# Altium footprint library CDPcomponents.PcbLib: 40 footprints (part 2 of 3)
Each footprint in its own frame and in the unit in brackets; x right, y up, seen from the top. Pads: shape width x height; smd on the part's side, far side on the other; paste and mask are expansions set on the pad; w line width, h text height; cw(c..) or ccw(c..) is an arc to the next point about the centre after c.
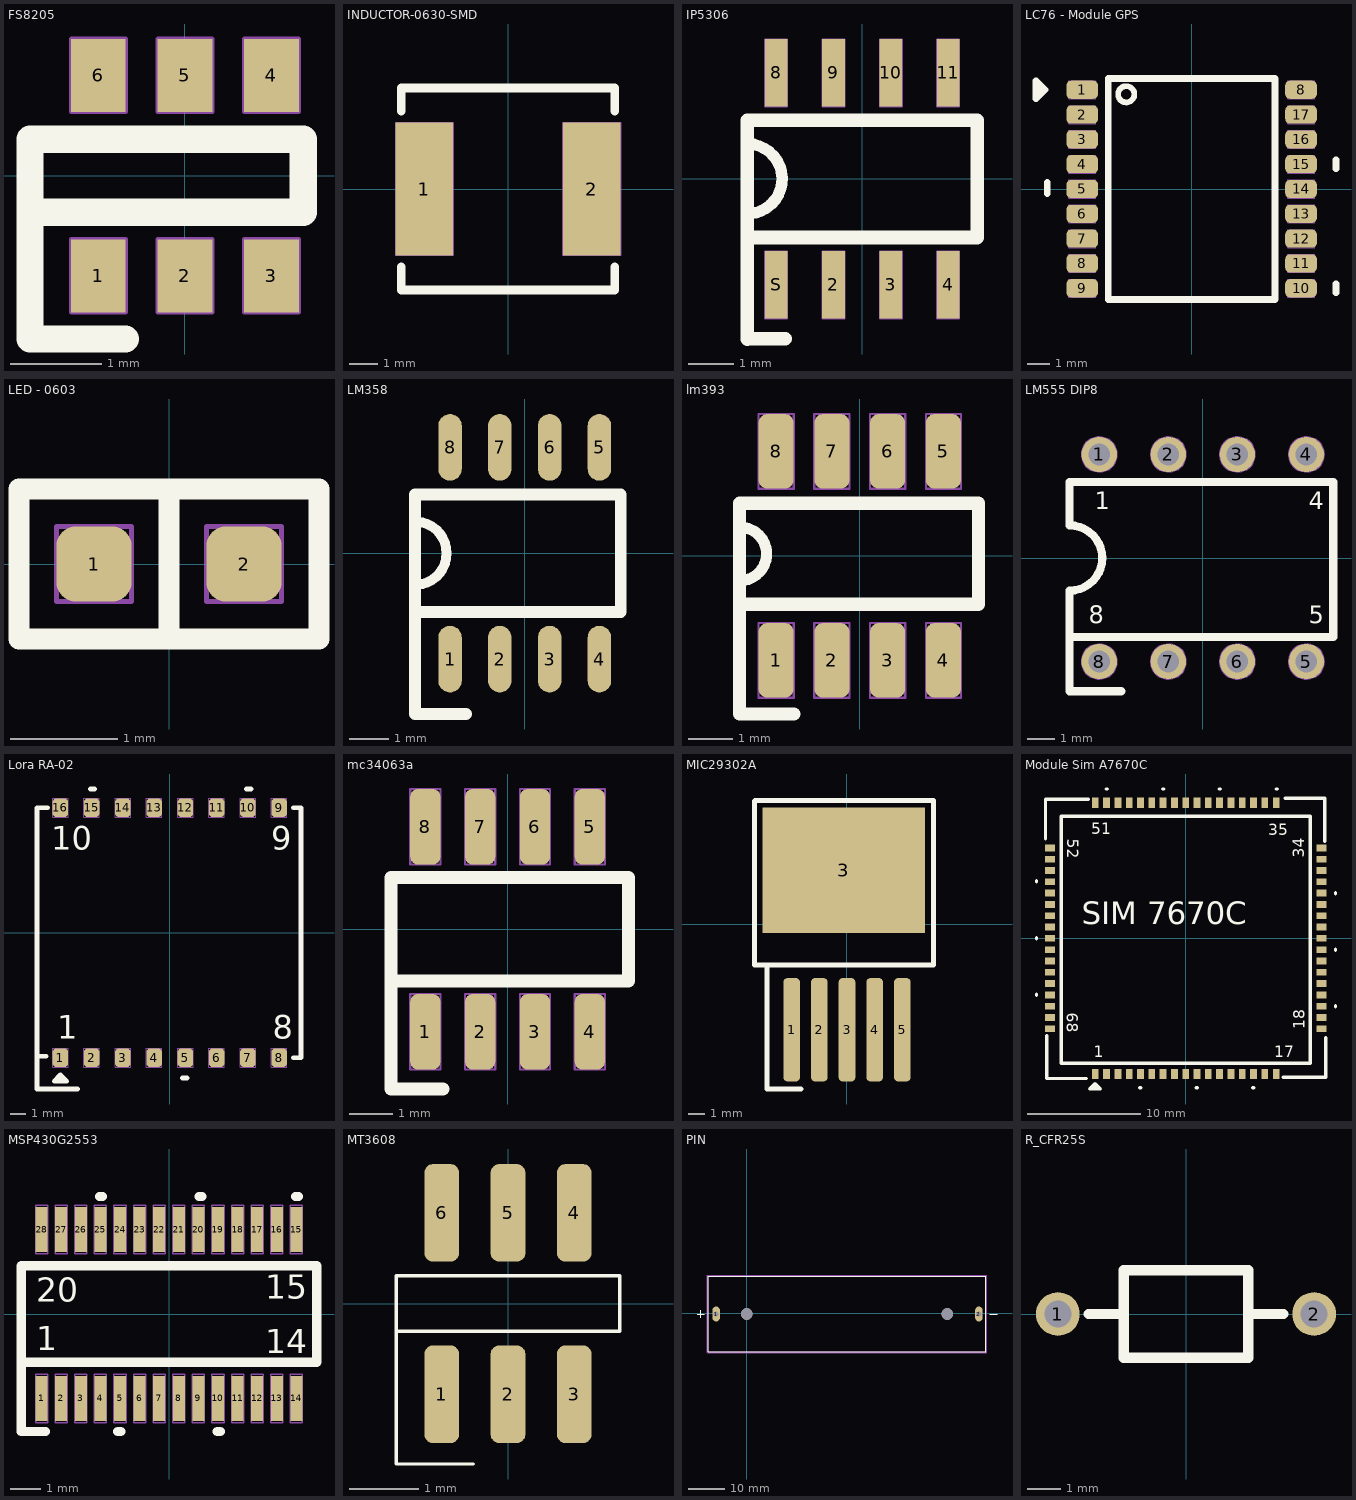
[diagram p1: the footprints below, top view; thin cyan lines are the x and y axes]

## FS8205 [mm]
pads (6):
  rect 0.6x0.8 smd: 1(-0.95,-1.1) 2(0,-1.1) 3(0.95,-1.1) 4(0.95,1.1) 5(0,1.1) 6(-0.95,1.1)
Top Overlay:
  lines w0.3: -1.6,-0.4 1.3,-0.4 1.3,0.4 -1.7,0.4 -1.7,-1.793 -0.652,-1.793
Mechanical 1:
  lines w0.05: -1.25,-1.5 -1.25,-0.7 -0.65,-0.7 -0.65,-1.5 -1.25,-1.5 ; -1.25,0.7 -0.65,0.7 -0.65,1.5 -1.25,1.5 -1.25,0.7 ; -0.3,-1.5 -0.3,-0.7 0.3,-0.7 0.3,-1.5 -0.3,-1.5 ; -0.3,0.7 0.3,0.7 0.3,1.5 -0.3,1.5 -0.3,0.7 ; 0.65,-1.5 0.65,-0.7 1.25,-0.7 1.25,-1.5 0.65,-1.5 ; 0.65,0.7 1.25,0.7 1.25,1.5 0.65,1.5 0.65,0.7
3D body "FS8205.stp": height 1.43, standoff -0.02, extent -1.45,-1.4 1.45,1.4

## INDUCTOR-0630-SMD [mm]
pads (2):
  rect 2x4.6 smd: 1(-2.9,0) 2(2.9,0)
Top Overlay:
  lines w0.3: -3.7,-2.7 -3.7,-3.5 3.7,-3.5 3.7,-2.7 ; -3.7,2.7 -3.7,3.5 3.7,3.5 3.7,2.7
Mechanical 1:
  lines w0.05: -3.9,-2.3 -3.9,2.3 -1.9,2.3 -1.9,-2.3 -3.9,-2.3 ; 1.9,-2.3 3.9,-2.3 3.9,2.3 1.9,2.3 1.9,-2.3
3D body "User Library-FXL0630 v3.STEP": height 2.8, standoff 0, extent -3.5,-3.3 3.5,3.3

## IP5306 [mm]
pads (8):
  rect 0.5x1.5 smd: 2(-0.635,-2.35) 3(0.635,-2.35) 4(1.905,-2.35) 8(-1.905,2.35) 9(-0.635,2.35) 10(0.635,2.35) 11(1.905,2.35) S(-1.905,-2.35)
Top Overlay:
  lines w0.254: -2.495,-0.774 ccw(c-2.55,0) -2.407,0.763
  lines w0.3: -1.7,-3.549 -2.549,-3.549 -2.55,-3.55 -2.55,-1.3 ; -2.55,-1.3 2.55,-1.3 2.55,1.3 -2.55,1.3 -2.55,-1.3
Mechanical 1:
  lines w0.03: -2.155,-3.1 -2.155,-1.6 -1.655,-1.6 -1.655,-3.1 -2.155,-3.1 ; -2.155,1.6 -1.655,1.6 -1.655,3.1 -2.155,3.1 -2.155,1.6 ; -0.885,-3.1 -0.885,-1.6 -0.385,-1.6 -0.385,-3.1 -0.885,-3.1 ; -0.885,1.6 -0.385,1.6 -0.385,3.1 -0.885,3.1 -0.885,1.6 ; 0.385,-3.1 0.385,-1.6 0.885,-1.6 0.885,-3.1 0.385,-3.1 ; 0.385,1.6 0.885,1.6 0.885,3.1 0.385,3.1 0.385,1.6 ; 1.655,-3.1 1.655,-1.6 2.155,-1.6 2.155,-3.1 1.655,-3.1 ; 1.655,1.6 2.155,1.6 2.155,3.1 1.655,3.1 1.655,1.6
3D body "IP5306_4.35V.stp": height 1.65, standoff 0, extent -2.45,-3 2.45,3

## LC76 - Module GPS [mm] "LC760Z00AAMD"
height 30
pads (18):
  rrect50% 1.4x0.8 smd: 1(-4.85,4.4) 2(-4.85,3.3) 3(-4.85,2.2) 4(-4.85,1.1) 5(-4.85,0) 6(-4.85,-1.1) 7(-4.85,-2.2) 8(-4.85,-3.3) 8(4.85,4.4) 9(-4.85,-4.4) 10(4.85,-4.4) 11(4.85,-3.3) 12(4.85,-2.2) 13(4.85,-1.1) 14(4.85,0) 15(4.85,1.1) 16(4.85,2.2) 17(4.85,3.3)
Top Overlay:
  circle w0.254: c-2.9,4.2 r0.361
  lines w0.3: -6.9,4.4 -6.7,4.4 ; -6.4,-0.2 -6.4,0.3 ; 6.4,-4.6 6.4,-4.2 ; 6.4,0.9 6.4,1.3 ; -6.9,4.8 -6.9,4 -6.5,4.4 -6.9,4.8 ; -6.9,4.8 -6.9,4.8 ; -3.7,-4.9 3.7,-4.9 3.7,4.9 0.15,4.9 -3.7,4.9 -3.7,-4.9
Mechanical 1:
  lines w0.05: -5.45,-4.8 -5.45,-4 -4.25,-4 -4.25,-4.8 -5.45,-4.8 ; -5.45,-3.7 -5.45,-2.9 -4.25,-2.9 -4.25,-3.7 -5.45,-3.7 ; -5.45,-2.6 -5.45,-1.8 -4.25,-1.8 -4.25,-2.6 -5.45,-2.6 ; -5.45,-1.5 -5.45,-0.7 -4.25,-0.7 -4.25,-1.5 -5.45,-1.5 ; -5.45,-0.4 -5.45,0.4 -4.25,0.4 -4.25,-0.4 -5.45,-0.4 ; -5.45,0.7 -5.45,1.5 -4.25,1.5 -4.25,0.7 -5.45,0.7 ; -5.45,1.8 -5.45,2.6 -4.25,2.6 -4.25,1.8 -5.45,1.8 ; -5.45,2.9 -5.45,3.7 -4.25,3.7 -4.25,2.9 -5.45,2.9 ; -5.45,4 -4.25,4 -4.25,4.8 -5.45,4.8 -5.45,4 ; 4.25,-4.8 5.45,-4.8 5.45,-4 4.25,-4 4.25,-4.8 ; 4.25,-3.7 4.25,-2.9 5.45,-2.9 5.45,-3.7 4.25,-3.7 ; 4.25,-2.6 4.25,-1.8 5.45,-1.8 5.45,-2.6 4.25,-2.6 ; 4.25,-1.5 4.25,-0.7 5.45,-0.7 5.45,-1.5 4.25,-1.5 ; 4.25,-0.4 4.25,0.4 5.45,0.4 5.45,-0.4 4.25,-0.4 ; 4.25,0.7 4.25,1.5 5.45,1.5 5.45,0.7 4.25,0.7 ; 4.25,1.8 4.25,2.6 5.45,2.6 5.45,1.8 4.25,1.8 ; 4.25,2.9 4.25,3.7 5.45,3.7 5.45,2.9 4.25,2.9 ; 4.25,4 4.25,4.8 5.45,4.8 5.45,4 4.25,4
3D body "Quectel L76-L.stp": height 2.51, standoff -0.01, extent -4.65,-5.05 5.05,5.05

## LED - 0603 [mm]
pads (2):
  rrect50% 0.7x0.7 smd: 1(-0.7,0) 2(0.7,0)
Top Overlay:
  lines w0.2: 0,-0.7 0,0.7 ; -1.4,-0.7 1.4,-0.7 1.4,0.7 0.2,0.7 -1.4,0.7 -1.4,-0.7
Mechanical 1:
  lines w0.05: -1.05,-0.35 -0.7,-0.35 -0.35,-0.35 -0.35,0.35 -1.05,0.35 -1.05,-0.35 ; 0.35,-0.35 0.35,0.35 0.7,0.35 1.05,0.35 1.05,-0.35 0.35,-0.35
3D body "LED0603_Orange.step": height 0.9, standoff 0, extent -0.85,-0.45 0.85,0.45

## LM358 [mm]
pads (8):
  oval 0.6x1.7 smd: 1(-1.905,-2.7) 2(-0.635,-2.7) 3(0.635,-2.7) 4(1.905,-2.7) 5(1.905,2.7) 6(0.635,2.7) 7(-0.635,2.7) 8(-1.905,2.7)
Top Overlay:
  lines w0.254: -2.75,-0.806 ccw(c-2.8,0) -2.75,0.806
  lines w0.3: -1.5,-4.1 -2.8,-4.1 -2.8,-1.5 ; -2.8,-1.5 -2.8,1.5 2.45,1.5 2.45,-1.5 -2.8,-1.5
3D body "LM358D.stp": height 1.63, standoff 0, extent -2.451,-3.011 2.451,3.011

## lm393 [mm]
pads (8):
  rrect50% 0.8x1.7 smd: 1(-1.905,-2.38) 2(-0.635,-2.38) 3(0.635,-2.38) 4(1.905,-2.38) 5(1.905,2.38) 6(0.635,2.38) 7(-0.635,2.38) 8(-1.905,2.38)
Top Overlay:
  lines w0.254: -2.728,-0.564 ccw(c-2.728,0.044) -2.728,0.653
  lines w0.3: -2.731,-1.1 2.7,-1.1 2.7,1.2 -2.731,1.2 -2.739,1.192 -2.739,-3.6 -1.5,-3.6
Mechanical 1:
  lines w0.05: -2.105,-1.53 -1.505,-1.53 -1.505,-3.23 -2.305,-3.23 -2.305,-1.53 -1.905,-1.53 ; -1.905,1.53 -1.505,1.53 -1.505,3.23 -2.305,3.23 -2.305,1.53 -1.705,1.53 ; -0.835,-1.53 -0.235,-1.53 -0.235,-3.23 -1.035,-3.23 -1.035,-1.53 -0.635,-1.53 ; -0.635,1.53 -0.235,1.53 -0.235,3.23 -1.035,3.23 -1.035,1.53 -0.435,1.53 ; 0.435,-1.53 1.035,-1.53 1.035,-3.23 0.235,-3.23 0.235,-1.53 0.635,-1.53 ; 0.635,1.53 1.035,1.53 1.035,3.23 0.235,3.23 0.235,1.53 0.835,1.53 ; 1.705,-1.53 2.305,-1.53 2.305,-3.23 1.505,-3.23 1.505,-1.53 1.905,-1.53 ; 1.905,1.53 2.305,1.53 2.305,3.23 1.505,3.23 1.505,1.53 2.105,1.53
3D body "LM393D.stp": height 1.63, standoff 0, extent -2.451,-3.011 2.451,3.011

## LM555 DIP8 [mm] "LM555 DIP8"
height 4.2
pads (8):
  round 1.3 hole 0.8 mask+0.1: 1(-3.81,3.81) 2(-1.27,3.81) 3(1.27,3.81) 4(3.81,3.81) 5(3.81,-3.81) 6(1.27,-3.81) 7(-1.27,-3.81) 8(-3.81,-3.81)
Top Overlay:
  lines w0.3: -3,-4.9 -4.9,-4.9 -4.9,-2.9 ; -4.9,-2.9 4.8,-2.9 4.8,2.8 -4.8,2.8 -4.9,2.8 -4.9,1.2 cw(c-4.9,0) -4.9,-1.2 -4.9,-2.9
  text "1" at -3.983,1.8 h0.65
  text "4" at 3.9,1.8 h0.65
  text "8" at -4.2,-2.4 h0.65
  text "5" at 3.9,-2.4 h0.65
Mechanical 1:
  circle w0.05: c-3.81,3.81 r0.65
  circle w0.05: c-1.27,3.81 r0.65
  circle w0.05: c1.27,3.81 r0.65
  circle w0.05: c3.81,3.81 r0.65
  circle w0.05: c-3.81,-3.81 r0.65
  circle w0.05: c-1.27,-3.81 r0.65
  circle w0.05: c1.27,-3.81 r0.65
  circle w0.05: c3.81,-3.81 r0.65
  lines w0.05: -4.9,-3 4.9,-3 4.9,2.9 -4.9,2.9 -4.9,1.237 cw(c-4.9,0) -4.9,-1.237 -4.9,-3
3D body "LM555CN.stp": height 5.21, standoff -2.37, extent -4.735,-4.202 4.536,4.002

## Lora RA-02 [mm] "Lora RA-02"
height 12
pads (16):
  rrect50% 1x1.2 smd: 1(-7,-8) 2(-5,-8) 3(-3,-8) 4(-1,-8) 5(1,-8) 6(3,-8) 7(5,-8) 8(7,-8) 9(7,8) 10(5,8) 11(3,8) 12(1,8) 13(-1,8) 14(-3,8) 15(-5,8) 16(-7,8)
Top Overlay:
  lines w0.3: -7.9,-7.9 -8.5,-7.9 ; -7.8,8 -8.5,8 -8.5,-7.9 ; -6.9,-9.3 -6.9,-9.2 ; -5.9,-10 -8.5,-10 -8.5,-7.9 ; -5.1,9.2 -4.8,9.2 ; 0.8,-9.3 1.1,-9.3 ; 4.9,9.2 5.2,9.2 ; 7.9,-8 8.4,-8 8.4,8 7.9,8 ; -7.4,-9.5 -7,-9.1 -6.6,-9.5 -7.4,-9.5
  text "10" at -7.6,5.3 h1.5
  text "9" at 6.5,5.3 h1.5
  text "8" at 6.6,-6.8 h1.5
  text "1" at -7.2,-6.8 h1.5
Mechanical 1:
  lines w0.05: -7.5,-8.6 -7.5,-7.4 ; -7.5,-8.6 -6.5,-8.6 ; -7.5,-8.6 -6.5,-8.6 ; -7.5,-8.6 -7.5,-7.4 ; -7.5,-7.4 -6.5,-7.4 ; -7.5,-7.4 -6.5,-7.4 ; -6.5,-8.6 -6.5,-7.4 ; -6.5,-8.6 -6.5,-7.4 ; 6.5,7.4 7.5,7.4 ; 6.5,7.4 6.5,8.6 ; 6.5,7.4 6.5,8.6 ; 6.5,7.4 7.5,7.4 ; 6.5,8.6 7.5,8.6 ; 6.5,8.6 7.5,8.6 ; 7.5,7.4 7.5,8.6 ; 7.5,7.4 7.5,8.6 ; -7.5,7.4 -7.5,8.6 -6.5,8.6 -6.5,7.4 -7.5,7.4 ; -5.5,-8.6 -5.5,-7.4 -4.5,-7.4 -4.5,-8.6 -5.5,-8.6 ; -5.5,7.4 -5.5,8.6 -4.5,8.6 -4.5,7.4 -5.5,7.4 ; -3.5,-8.6 -3.5,-7.4 -2.5,-7.4 -2.5,-8.6 -3.5,-8.6 ; -3.5,7.4 -3.5,8.6 -2.5,8.6 -2.5,7.4 -3.5,7.4 ; -1.5,-8.6 -1.5,-7.4 -0.5,-7.4 -0.5,-8.6 -1.5,-8.6 ; -1.5,7.4 -1.5,8.6 -0.5,8.6 -0.5,7.4 -1.5,7.4 ; 0.5,-8.6 0.5,-7.4 1.5,-7.4 1.5,-8.6 0.5,-8.6 ; 0.5,7.4 0.5,8.6 1.5,8.6 1.5,7.4 0.5,7.4 ; 2.5,-8.6 2.5,-7.4 3.5,-7.4 3.5,-8.6 2.5,-8.6 ; 2.5,7.4 2.5,8.6 3.5,8.6 3.5,7.4 2.5,7.4 ; 4.5,-8.6 4.5,-7.4 5.5,-7.4 5.5,-8.6 4.5,-8.6 ; 4.5,7.4 4.5,8.6 5.5,8.6 5.5,7.4 4.5,7.4 ; 6.5,-8.6 6.5,-7.4 7.5,-7.4 7.5,-8.6 6.5,-8.6
3D body "User Library-RA-02-2.STEP": height 3.2, standoff 0, extent -8.5,-8 8.5,8

## mc34063a [mm]
pads (8):
  rrect50% 0.7x1.75 smd: 1(-1.905,-2.375) 2(-0.635,-2.375) 3(0.635,-2.375) 4(1.905,-2.375) 5(1.905,2.375) 6(0.635,2.375) 7(-0.635,2.375) 8(-1.905,2.375)
Top Overlay:
  lines w0.3: -1.5,-3.7 -2.7,-3.7 -2.7,-1.2 ; -2.7,-1.2 -2.7,1.2 2.8,1.2 2.8,-1.2 -2.7,-1.2
Mechanical 1:
  lines w0.05: -2.255,-3.25 -1.555,-3.25 -1.555,-1.5 -2.255,-1.5 -2.255,-3.25 ; -2.255,1.5 -2.255,3.25 -1.555,3.25 -1.555,1.5 -2.255,1.5 ; -0.985,-3.25 -0.285,-3.25 -0.285,-1.5 -0.985,-1.5 -0.985,-3.25 ; -0.985,1.5 -0.985,3.25 -0.285,3.25 -0.285,1.5 -0.985,1.5 ; 0.285,-3.25 0.985,-3.25 0.985,-1.5 0.285,-1.5 0.285,-3.25 ; 0.285,1.5 0.285,3.25 0.985,3.25 0.985,1.5 0.285,1.5 ; 1.555,-3.25 2.255,-3.25 2.255,-1.5 1.555,-1.5 1.555,-3.25 ; 1.555,1.5 1.555,3.25 2.255,3.25 2.255,1.5 1.555,1.5
3D body "MC34063ADR2G.stp": height 1.75, standoff 0, extent -2.45,-3 2.45,3

## MIC29302A [mm] "MIC29302A - 3.3V 3A"
pads (6):
  rrect50% 1.02x6.35 smd: 1(-3.4,-6.477) 2(-1.7,-6.477) 3(0,-6.477) 4(1.7,-6.477) 5(3.4,-6.477)
  rect 10x7.7 smd: 3(-0.2,3.3)
Top Overlay:
  lines w0.3: -4.9,-2.5 -4.9,-10.115 -2.815,-10.115 ; -5.671,-2.5 5.3,-2.5 5.3,5.293 5.3,7.6 -5.641,7.6 -5.671,7.571 -5.671,5.505 -5.671,-2.5
3D body "User Library-MIC29302.STEP": height 4.36, standoff 0.05, extent -4.894,-6.366 4.758,7.101

## Module Sim A7670C [mm] "Module Sim A7670C"
height 15
pads (68):
  rect 0.6x0.9 smd mask+0.1: 1(-8,-12) 2(-7,-12) 3(-6,-12) 4(-5,-12) 5(-4,-12) 6(-3,-12) 7(-2,-12) 8(-1,-12) 9(0,-12) 10(1,-12) 11(2,-12) 12(3,-12) 13(4,-12) 14(5,-12) 15(6,-12) 16(7,-12) 17(8,-12) 35(8,12) 36(7,12) 37(6,12) 38(5,12) 39(4,12) 40(3,12) 41(2,12) 42(1,12) 43(0,12) 44(-1,12) 45(-2,12) 46(-3,12) 47(-4,12) 48(-5,12) 49(-6,12) 50(-7,12) 51(-8,12)
  rect 0.9x0.6 smd mask+0.1: 18(12,-8) 19(12,-7) 20(12,-6) 21(12,-5) 22(12,-4) 23(12,-3) 24(12,-2) 25(12,-1) 26(12,0) 27(12,1) 28(12,2) 29(12,3) 30(12,4) 31(12,5) 32(12,6) 33(12,7) 34(12,8) 52(-12,8) 53(-12,7) 54(-12,6) 55(-12,5) 56(-12,4) 57(-12,3) 58(-12,2) 59(-12,1) 60(-12,0) 61(-12,-1) 62(-12,-2) 63(-12,-3) 64(-12,-4) 65(-12,-5) 66(-12,-6) 67(-12,-7) 68(-12,-8)
Top Overlay:
  lines w0.3: -13.2,-5.04 -13.2,-4.94 ; -13.2,-0.05 -13.2,0.05 ; -13.2,4.98 -13.2,5.08 ; -12.4,8.8 -12.4,12.3 -8.6,12.3 ; -12.3,-8.6 -12.3,-12.4 -8.8,-12.4 ; -11,-10.85 -11,10.8 11,10.8 11,-11.05 -11,-11.05 -11,-0.65 ; -8.2,-13.3 -7.9,-13 ; -7.03,13.21 -6.93,13.21 ; -4.07,-13.21 -3.97,-13.21 ; -2.03,13.21 -1.93,13.21 ; 0.94,-13.21 1.04,-13.21 ; 2.97,13.21 3.07,13.21 ; 5.94,-13.21 6.04,-13.21 ; 7.99,13.21 8.09,13.21 ; 8.6,-12.3 12.4,-12.3 12.4,-8.8 ; 8.8,12.4 12.3,12.4 12.3,8.6 ; 13.25,-6.06 13.25,-5.96 ; 13.25,-1.06 13.25,-0.96 ; 13.25,3.93 13.25,4.03 ; -8.475,-13.325 -7.575,-13.325 -8.025,-12.875 -8.475,-13.325
  text "SIM 7670C" at -9.21,1.23 h2
  text "51" at -8.34,9.22 h1
  text "52" at -10.47,8.81 h1
  text "35" at 7.31,9.12 h1
  text "34" at 10.5,7.144 h1
  text "68" at -10.52,-6.56 h1
  text "1" at -8.14,-10.51 h1
  text "18" at 10.54,-8.06 h1
  text "17" at 7.81,-10.51 h1
3D body "User Library-A7670.STEP": height 2.3, standoff 0, extent -12,-12 12,12

## MSP430G2553 [mm] "MSP430G2553 (PW-G28)"
height 1.4
pads (28):
  rect 0.4x1.5 smd mask+0.1: 1(-4.225,-2.8) 2(-3.575,-2.8) 3(-2.925,-2.8) 4(-2.275,-2.8) 5(-1.625,-2.8) 6(-0.975,-2.8) 7(-0.325,-2.8) 8(0.325,-2.8) 9(0.975,-2.8) 10(1.625,-2.8) 11(2.275,-2.8) 12(2.925,-2.8) 13(3.575,-2.8) 14(4.225,-2.8) 15(4.225,2.8) 16(3.575,2.8) 17(2.925,2.8) 18(2.275,2.8) 19(1.625,2.8) 20(0.975,2.8) 21(0.325,2.8) 22(-0.325,2.8) 23(-0.975,2.8) 24(-1.625,2.8) 25(-2.275,2.8) 26(-2.925,2.8) 27(-3.575,2.8) 28(-4.225,2.8)
Top Overlay:
  lines w0.3: -4.1,-3.9 -4.9,-3.9 -4.9,-1.6 ; -2.3,3.9 -2.2,3.9 ; -1.7,-3.9 -1.6,-3.9 ; 1,3.9 1.1,3.9 ; 1.6,-3.9 1.7,-3.9 ; 4.2,3.9 4.3,3.9 ; -4.9,-1.6 4.9,-1.6 4.9,1.6 -0.65,1.6 -4.9,1.6 -4.9,-1.6
  text "1" at -4.4,-1.2 h0.8
  text "14" at 3.2,-1.3 h0.8
  text "15" at 3.2,0.5 h0.8
  text "20" at -4.4,0.4 h0.8
Mechanical 1:
  drawing of 155 lines, arcs and shapes, not listed
3D body "MSP430G2553IPW28.stp": height 1.2, standoff 0, extent -4.85,-3.2 4.85,3.2

## MT3608 [mm]
pads (6):
  rrect50% 0.5x1.4 smd: 1(-0.95,-1.3) 2(0,-1.3) 3(0.95,-1.3) 4(0.95,1.3) 5(0,1.3) 6(-0.95,1.3)
Top Overlay:
  lines w0.05: -0.5,-2.3 -1.6,-2.3 -1.6,-0.4 ; 0,0.4 1.6,0.4 1.6,-0.4 -1.6,-0.4 ; 0.75,0.4 -1.6,0.4 -1.6,-0.4
3D body "MT3608.stp": height 1.45, standoff 0, extent -1.45,-1.4 1.45,1.4

## PIN [mm]
pads (4):
  oval 2.07x4.14 hole 1.38 square: 1(-8.495,-0.2) 2(64.405,-0.2)
  round 3.2 hole 3.2 unplated: ""(0,-0.2) ""(55.615,-0.2)
Top Overlay:
  lines w0.127: -13.825,-0.2 -11.825,-0.2 ; -12.825,-1.2 -12.825,0.8 ; 67.435,-0.2 69.435,-0.2 ; -10.675,-10.69 66.285,-10.69 66.285,10.29 -10.675,10.29 -10.675,-10.69
Mechanical 13:
  lines w0.127: -13.825,-0.2 -11.825,-0.2 ; -12.825,-1.2 -12.825,0.8 ; 67.435,-0.2 69.435,-0.2 ; -10.675,-10.69 66.285,-10.69 66.285,10.29 -10.675,10.29 -10.675,-10.69
Top Courtyard:
  lines w0.05: -10.925,-10.94 66.535,-10.94 66.535,10.54 -10.925,10.54 -10.925,-10.94
3D body "BH-18650-A1AJ005.stp": height 21.91, standoff -5, extent -11.4,-10.65 66.3,10.25

## R_CFR25S [mm] "R 1/4W"
height 2.1
pads (2):
  round 1.3 hole 0.8 mask+0.1: 1(-3.81,0) 2(3.81,0)
Top Overlay:
  lines w0.3: -2.9,0 -1.85,0 ; 1.85,0 2.9,0 ; -1.85,-1.3 -1.85,1.3 1.85,1.3 1.85,-1.3 -1.85,-1.3
Mechanical 1:
  circle w0.05: c-3.81,0 r0.583
  circle w0.05: c3.81,0 r0.583
  lines w0.05: -3,0 -1.85,0 ; 1.85,0 3,0 ; -1.85,-1.3 -1.85,1.3 0,1.3 1.85,1.3 1.85,-1.3 -1.85,-1.3